# Altium footprint library Tomra_Cadstar_Footprints.PcbLib: 380 footprints (part 18 of 24)
Each footprint in its own frame and in the unit in brackets; x right, y up, seen from the top. Pads: shape width x height; smd on the part's side, far side on the other; paste and mask are expansions set on the pad; w line width, h text height; cw(c..) or ccw(c..) is an arc to the next point about the centre after c.
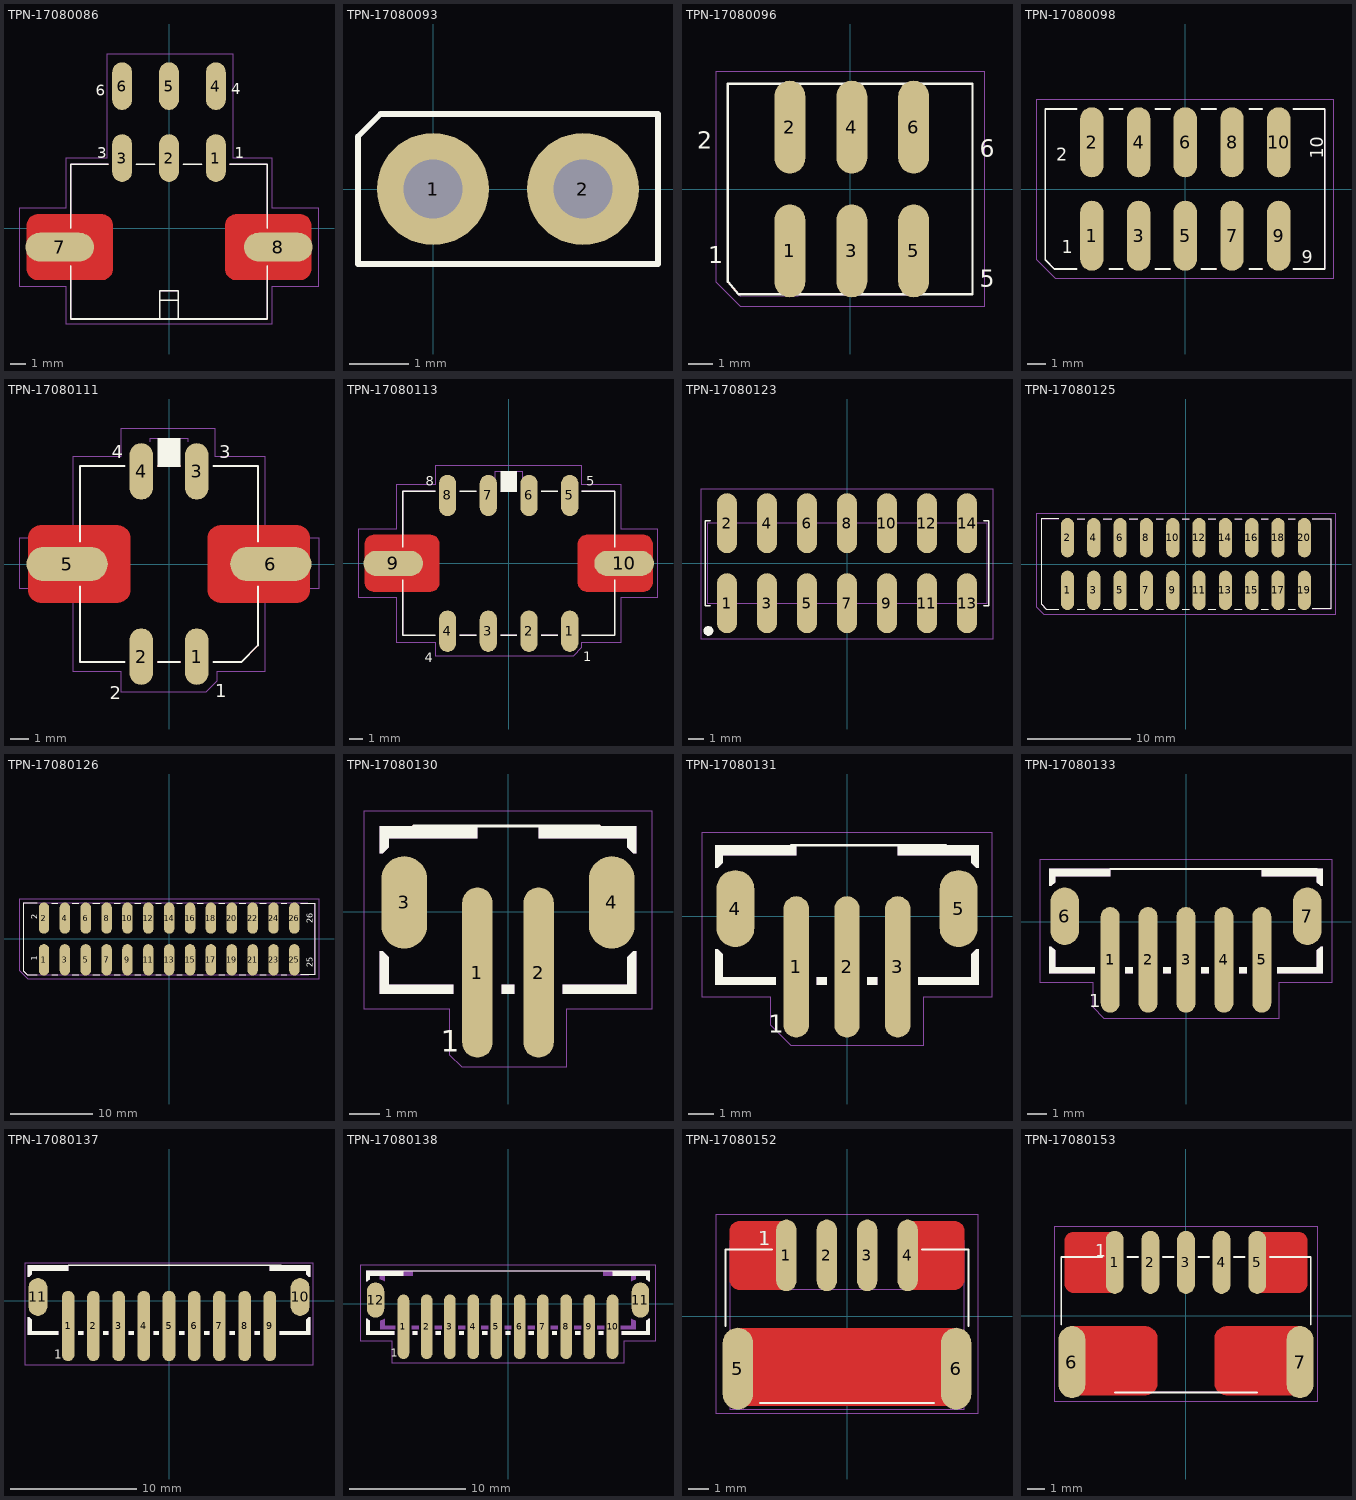
[diagram p17: the footprints below, top view; thin cyan lines are the x and y axes]

## TPN-17080086 [mm]
height 8
pads (8):
  oval 1.27x3.048 smd paste+0 mask+0: 1(3,4.5) 2(0,4.5) 3(-3,4.5) 4(3,9.1) 5(0,9.1) 6(-3,9.1)
  oval 4.39x1.85 smd paste+0 mask+0: 7(-7,-1.2) 8(7,-1.2)
Top Elec:
  region: -9.1,0.2 -9.1,0.269 -9.073,0.404 -9.02,0.532 -8.944,0.646 -8.846,0.744 -8.732,0.82 -8.604,0.873 -8.469,0.9 -8.4,0.9 -4.3,0.9 -4.231,0.9 -4.096,0.873 -3.968,0.82 -3.854,0.744 -3.756,0.646 -3.68,0.532 -3.627,0.404 -3.6,0.269 -3.6,0.2 -3.6,-2.6 -3.6,-2.669 -3.627,-2.804 -3.68,-2.932 -3.756,-3.046 -3.854,-3.144 -3.968,-3.22 -4.096,-3.273 -4.231,-3.3 -4.3,-3.3 -8.4,-3.3 -8.469,-3.3 -8.604,-3.273 -8.732,-3.22 -8.846,-3.144 -8.944,-3.046 -9.02,-2.932 -9.073,-2.804 -9.1,-2.669 -9.1,-2.6
  region: 3.6,0.2 3.6,0.269 3.627,0.404 3.68,0.532 3.756,0.646 3.854,0.744 3.968,0.82 4.096,0.873 4.231,0.9 4.3,0.9 8.4,0.9 8.469,0.9 8.604,0.873 8.732,0.82 8.846,0.744 8.944,0.646 9.02,0.532 9.073,0.404 9.1,0.269 9.1,0.2 9.1,-2.6 9.1,-2.669 9.073,-2.804 9.02,-2.932 8.944,-3.046 8.846,-3.144 8.732,-3.22 8.604,-3.273 8.469,-3.3 8.4,-3.3 4.3,-3.3 4.231,-3.3 4.096,-3.273 3.968,-3.22 3.854,-3.144 3.756,-3.046 3.68,-2.932 3.627,-2.804 3.6,-2.669 3.6,-2.6
Top Silk:
  lines w0.1: -6.3,-2.4 -6.3,-5.8 6.3,-5.8 6.3,-2.4 ; -6.3,0 -6.3,4.1 -3.9,4.1 ; -2.1,4.1 -0.9,4.1 ; -0.6,-4.6 0.6,-4.6 ; 0.9,4.1 2.1,4.1 ; 3.9,4.1 6.3,4.1 6.3,0 ; -0.6,-5.8 0.6,-5.8 0.6,-4 -0.6,-4 -0.6,-5.8
  text "1" at 4.2,4.5 h0.7
  text "6" at -4.7,8.5 h0.7
  text "3" at -4.6,4.5 h0.7
  text "4" at 4,8.6 h0.7
  text ".Designator" at 0,0 h0.7
Top Assembly:
  lines w0.05: -6.3,-2.4 -6.3,-5.8 6.3,-5.8 6.3,-2.4 ; -6.3,0 -6.3,4.1 -3.9,4.1 ; -2.1,4.1 -0.9,4.1 ; -0.6,-4.6 0.6,-4.6 ; 0.9,4.1 2.1,4.1 ; 3.9,4.1 6.3,4.1 6.3,0 ; -0.6,-5.8 0.6,-5.8 0.6,-4 -0.6,-4 -0.6,-5.8
  text "1" at 4.2,4.5 h0.7
  text "6" at -4.7,8.5 h0.7
  text "3" at -4.6,4.5 h0.7
  text "4" at 4,8.6 h0.7
Top Placement:
  lines w0.01: -9.6,-3.7 -9.6,1.3 -6.6,1.3 -6.6,4.5 -4,4.5 -4,11.14 4.1,11.14 4.1,4.5 6.6,4.5 6.6,1.3 9.6,1.3 9.6,-3.7 6.6,-3.7 6.6,-6.1 -6.6,-6.1 -6.6,-3.7 -9.6,-3.7
  text "1" at 4.2,4.5 h0.7
  text "6" at -4.7,8.5 h0.7
  text "3" at -4.6,4.5 h0.7
  text "4" at 4,8.6 h0.7

## TPN-17080093 [mm]
height 9
pads (2):
  round 1.9 / inner round 1.524 / far side round 1.9 hole 1 paste+0.25 mask+0: 1(0,0) 2(2.54,0)
Top Silk:
  lines w0.1: -1.27,-1.27 -1.27,0.889 -0.889,1.27 3.81,1.27 3.81,-1.27 -1.27,-1.27
  text ".Designator" at -1.24,1.46 h0.7
Top Assembly:
  lines w0.05: -1.27,-1.27 -1.27,0.889 -0.889,1.27 3.81,1.27 3.81,-1.27 -1.27,-1.27
Top Placement:
  lines w0.01: -1.27,-1.27 -1.27,0.889 -0.889,1.27 3.81,1.27 3.81,-1.27 -1.27,-1.27

## TPN-17080096 [mil]
height 472.44
pads (6):
  oval 50x150 smd paste+0 mask+0: 1(-97.5,-100) 2(-97.5,100) 3(2.5,-100) 4(2.5,100) 5(102.5,-100) 6(102.5,100)
Top Silk:
  lines w3.94: -197.5,-150 -197.5,170 197.5,170 197.5,-170 -180.5,-170 -197.5,-150
  text "2" at -247.5,65 h27.56
  text "1" at -229.5,-120 h27.56
  text "6" at 209.5,52 h27.56
  text "5" at 209.5,-158 h27.56
  text ".Designator" at 0,0 h27.56
Top Assembly:
  lines w1.97: -197.5,-150 -197.5,170 197.5,170 197.5,-170 -177.5,-173 -197.5,-150
Top Placement:
  lines w0.39: -217.19,-150 -177.5,-189.69 217.19,-189.69 217.19,189.69 -217.19,189.69 -217.19,-150

## TPN-17080098 [mm]
height 12
pads (10):
  oval 1.27x3.81 smd paste+0 mask+0: 1(-5.08,-2.54) 2(-5.08,2.54) 3(-2.54,-2.54) 4(-2.54,2.54) 5(0,-2.54) 6(0,2.54) 7(2.54,-2.54) 8(2.54,2.54) 9(5.08,-2.54) 10(5.08,2.54)
Top Silk:
  lines w0.1: -5.92,-4.35 -7.12,-4.35 -7.62,-3.85 -7.62,4.35 -5.92,4.35 ; -4.12,-4.35 -3.42,-4.35 ; -4.12,4.35 -3.42,4.35 ; -1.62,-4.35 -0.82,-4.35 ; -1.62,4.35 -0.82,4.35 ; 0.88,-4.35 1.68,-4.35 ; 0.88,4.35 1.68,4.35 ; 3.48,-4.35 4.18,-4.35 ; 3.48,4.35 4.18,4.35 ; 5.88,-4.35 7.58,-4.35 7.58,4.35 5.88,4.35
  text "1" at -6.731,-3.505 h0.7
  text "2" at -7.01,1.549 h0.7
  text "10" at 7.493,1.651 h0.7
  text "9" at 6.325,-4.039 h0.7
  text ".Designator" at 0,0 h0.7
Top Assembly:
  lines w0.05: -5.92,-4.35 -7.12,-4.35 -7.62,-3.85 -7.62,4.35 -5.92,4.35 ; -4.12,-4.35 -3.42,-4.35 ; -4.12,4.35 -3.42,4.35 ; -1.62,-4.35 -0.82,-4.35 ; -1.62,4.35 -0.82,4.35 ; 0.88,-4.35 1.68,-4.35 ; 0.88,4.35 1.68,4.35 ; 3.48,-4.35 4.18,-4.35 ; 3.48,4.35 4.18,4.35 ; 5.88,-4.35 7.58,-4.35 7.58,4.35 5.88,4.35
  text "1" at -6.731,-3.505 h0.7
  text "2" at -7.01,1.549 h0.7
  text "10" at 7.493,1.651 h0.7
  text "9" at 6.325,-4.039 h0.7
Top Placement:
  lines w0.01: -8.12,-3.81 -7.08,-4.85 8.08,-4.85 8.08,4.85 -8.12,4.85 -8.12,-3.81

## TPN-17080111 [mm]
pads (6):
  oval 1.27x3.048 smd paste+0 mask+0: 1(1.5,-5) 2(-1.5,-5) 3(1.5,5) 4(-1.5,5)
  oval 4.39x1.85 smd paste+0 mask+0: 5(-5.5,0) 6(5.5,0)
Top Elec:
  region: -7.6,1.4 -7.6,1.469 -7.573,1.604 -7.52,1.732 -7.444,1.846 -7.346,1.944 -7.232,2.02 -7.104,2.073 -6.969,2.1 -6.9,2.1 -2.8,2.1 -2.731,2.1 -2.596,2.073 -2.468,2.02 -2.354,1.944 -2.256,1.846 -2.18,1.732 -2.127,1.604 -2.1,1.469 -2.1,1.4 -2.1,-1.4 -2.1,-1.469 -2.127,-1.604 -2.18,-1.732 -2.256,-1.846 -2.354,-1.944 -2.468,-2.02 -2.596,-2.073 -2.731,-2.1 -2.8,-2.1 -6.9,-2.1 -6.969,-2.1 -7.104,-2.073 -7.232,-2.02 -7.346,-1.944 -7.444,-1.846 -7.52,-1.732 -7.573,-1.604 -7.6,-1.469 -7.6,-1.4
  region: 2.1,1.4 2.1,1.469 2.127,1.604 2.18,1.732 2.256,1.846 2.354,1.944 2.468,2.02 2.596,2.073 2.731,2.1 2.8,2.1 6.9,2.1 6.969,2.1 7.104,2.073 7.232,2.02 7.346,1.944 7.444,1.846 7.52,1.732 7.573,1.604 7.6,1.469 7.6,1.4 7.6,-1.4 7.6,-1.469 7.573,-1.604 7.52,-1.732 7.444,-1.846 7.346,-1.944 7.232,-2.02 7.104,-2.073 6.969,-2.1 6.9,-2.1 2.8,-2.1 2.731,-2.1 2.596,-2.073 2.468,-2.02 2.354,-1.944 2.256,-1.846 2.18,-1.732 2.127,-1.604 2.1,-1.469 2.1,-1.4
Top Silk:
  region: -0.6,5.3 0.6,5.3 0.6,6.8 -0.6,6.8
  lines w0.1: -4.8,-1.2 -4.8,-5.3 -2.4,-5.3 ; -4.8,1.2 -4.8,5.3 -2.4,5.3 ; -0.6,-5.3 0.6,-5.3 ; -0.6,5.3 0.6,5.3 ; 2.4,-5.3 3.9,-5.3 4.8,-4.4 4.8,-1.2 ; 2.4,5.3 4.8,5.3 4.8,1.2
  text "1" at 2.5,-7.2 h0.7
  text "3" at 2.7,5.7 h0.7
  text "4" at -3.1,5.7 h0.7
  text "2" at -3.2,-7.3 h0.7
  text ".Designator" at -1,6.8 h0.7
Top Assembly:
  lines w0.05: -4.8,-1.2 -4.8,-5.3 -2.4,-5.3 ; -4.8,1.2 -4.8,5.3 -2.4,5.3 ; -1,6.6 -1,6.8 1,6.8 1,6.6 ; -0.6,-5.3 0.6,-5.3 ; -0.6,5.3 0.6,5.3 ; 2.4,-5.3 3.9,-5.3 4.8,-4.4 4.8,-1.2 ; 2.4,5.3 4.8,5.3 4.8,1.2
  text "1" at 2.5,-7.2 h0.7
  text "3" at 2.7,5.7 h0.7
  text "4" at -3.1,5.7 h0.7
  text "2" at -3.2,-7.3 h0.7
Top Placement:
  lines w0.01: -8.1,-1.3 -8.1,1.4 -5.2,1.4 -5.2,5.8 -2.6,5.8 -2.6,7.3 2.5,7.3 2.5,5.8 5.2,5.8 5.2,1.4 8.1,1.4 8.1,-1.3 5.2,-1.3 5.2,-5.8 2.6,-5.8 2.6,-6.3 2,-6.9 -2.6,-6.9 -2.6,-5.8 -5.2,-5.8 -5.2,-1.3 -8.1,-1.3
  text "1" at 2.5,-7.2 h0.7
  text "3" at 2.7,5.7 h0.7
  text "4" at -3.1,5.7 h0.7
  text "2" at -3.2,-7.3 h0.7

## TPN-17080113 [mm]
pads (10):
  oval 1.27x3.048 smd paste+0 mask+0: 1(4.5,-5) 2(1.5,-5) 3(-1.5,-5) 4(-4.5,-5) 5(4.5,5) 6(1.5,5) 7(-1.5,5) 8(-4.5,5)
  oval 4.39x1.85 smd paste+0 mask+0: 9(-8.5,0) 10(8.5,0)
Top Elec:
  region: -10.6,1.4 -10.6,1.469 -10.573,1.604 -10.52,1.732 -10.444,1.846 -10.346,1.944 -10.232,2.02 -10.104,2.073 -9.969,2.1 -9.9,2.1 -5.8,2.1 -5.731,2.1 -5.596,2.073 -5.468,2.02 -5.354,1.944 -5.256,1.846 -5.18,1.732 -5.127,1.604 -5.1,1.469 -5.1,1.4 -5.1,-1.4 -5.1,-1.469 -5.127,-1.604 -5.18,-1.732 -5.256,-1.846 -5.354,-1.944 -5.468,-2.02 -5.596,-2.073 -5.731,-2.1 -5.8,-2.1 -9.9,-2.1 -9.969,-2.1 -10.104,-2.073 -10.232,-2.02 -10.346,-1.944 -10.444,-1.846 -10.52,-1.732 -10.573,-1.604 -10.6,-1.469 -10.6,-1.4
  region: 5.1,1.4 5.1,1.469 5.127,1.604 5.18,1.732 5.256,1.846 5.354,1.944 5.468,2.02 5.596,2.073 5.731,2.1 5.8,2.1 9.9,2.1 9.969,2.1 10.104,2.073 10.232,2.02 10.346,1.944 10.444,1.846 10.52,1.732 10.573,1.604 10.6,1.469 10.6,1.4 10.6,-1.4 10.6,-1.469 10.573,-1.604 10.52,-1.732 10.444,-1.846 10.346,-1.944 10.232,-2.02 10.104,-2.073 9.969,-2.1 9.9,-2.1 5.8,-2.1 5.731,-2.1 5.596,-2.073 5.468,-2.02 5.354,-1.944 5.256,-1.846 5.18,-1.732 5.127,-1.604 5.1,-1.469 5.1,-1.4
Top Silk:
  region: -0.6,5.3 0.6,5.3 0.6,6.8 -0.6,6.8
  lines w0.1: -7.8,-1.2 -7.8,-5.3 -5.4,-5.3 ; -7.8,1.2 -7.8,5.3 -5.4,5.3 ; -3.6,-5.3 -2.4,-5.3 ; -3.6,5.3 -2.4,5.3 ; -0.6,-5.3 0.6,-5.3 ; -0.6,5.3 0.6,5.3 ; 2.4,-5.3 3.6,-5.3 ; 2.4,5.3 3.6,5.3 ; 5.4,-5.3 7.8,-5.3 7.8,-1.2 ; 5.4,5.3 7.8,5.3 7.8,1.2
  text "1" at 5.5,-7.2 h0.7
  text "4" at -6.2,-7.3 h0.7
  text "5" at 5.7,5.7 h0.7
  text "8" at -6.1,5.7 h0.7
  text ".Designator" at -1,6.8 h0.7
Top Assembly:
  lines w0.05: -7.8,-1.2 -7.8,-5.3 -5.4,-5.3 ; -7.8,1.2 -7.8,5.3 -5.4,5.3 ; -3.6,-5.3 -2.4,-5.3 ; -3.6,5.3 -2.4,5.3 ; -1,5.3 -1,6.8 1,6.8 1,5.3 ; -0.6,-5.3 0.6,-5.3 ; -0.6,5.3 0.6,5.3 ; 2.4,-5.3 3.6,-5.3 ; 2.4,5.3 3.6,5.3 ; 5.4,-5.3 7.8,-5.3 7.8,-1.2 ; 5.4,5.3 7.8,5.3 7.8,1.2
  text "1" at 5.5,-7.2 h0.7
  text "4" at -6.2,-7.3 h0.7
  text "5" at 5.7,5.7 h0.7
  text "8" at -6.1,5.7 h0.7
Top Placement:
  lines w0.01: -11.1,-2.5 -11.1,2.5 -8.3,2.5 -8.3,5.8 -5.4,5.8 -5.4,7.2 5.4,7.2 5.4,5.8 8.3,5.8 8.3,2.5 11,2.5 11,-2.5 8.3,-2.5 8.3,-5.8 5.4,-5.8 5.4,-6.2 4.8,-6.8 -5.4,-6.8 -5.4,-5.8 -8.3,-5.8 -8.3,-2.5 -11.1,-2.5
  text "1" at 5.5,-7.2 h0.7
  text "4" at -6.2,-7.3 h0.7
  text "5" at 5.7,5.7 h0.7
  text "8" at -6.1,5.7 h0.7

## TPN-17080123 [mm]
height 12
pads (14):
  oval 1.27x3.81 smd paste+0 mask+0: 1(-7.62,-2.54) 2(-7.62,2.54) 3(-5.08,-2.54) 4(-5.08,2.54) 5(-2.54,-2.54) 6(-2.54,2.54) 7(0,-2.54) 8(0,2.54) 9(2.54,-2.54) 10(2.54,2.54) 11(5.08,-2.54) 12(5.08,2.54) 13(7.62,-2.54) 14(7.62,2.54)
Top Silk:
  region: -8.8,-4.6 -8.86,-4.6 -8.97,-4.554 -9.054,-4.47 -9.1,-4.36 -9.1,-4.24 -9.054,-4.13 -8.97,-4.046 -8.86,-4 -8.8,-4 -8.74,-4 -8.63,-4.046 -8.546,-4.13 -8.5,-4.24 -8.5,-4.36 -8.546,-4.47 -8.63,-4.554 -8.74,-4.6
  lines w0.1: -8.7,-2.7 -9,-2.7 -9,2.7 -8.7,2.7 ; 8.7,-2.7 9,-2.7 9,2.7 8.7,2.7
  text ".Designator" at -7.7,4.7 h0.7
Top Assembly:
  lines w0.05: -8.89,-2.54 8.89,-2.54 8.89,2.54 -8.89,2.54 -8.89,-2.54
  text "2" at -8.7,2.7 h0.18
  text "14" at 8.5,2.6 h0.18
  text "13" at 8.5,-3.1 h0.18
  text "1" at -8.6,-3.1 h0.18
Top Placement:
  lines w0.01: -9.3,-4.8 9.3,-4.8 9.3,4.7 -9.3,4.7 -9.3,-4.8

## TPN-17080125 [mm]
height 12
pads (20):
  oval 1.27x3.81 smd paste+0 mask+0: 1(-11.43,-2.54) 2(-11.43,2.54) 3(-8.89,-2.54) 4(-8.89,2.54) 5(-6.35,-2.54) 6(-6.35,2.54) 7(-3.81,-2.54) 8(-3.81,2.54) 9(-1.27,-2.54) 10(-1.27,2.54) 11(1.27,-2.54) 12(1.27,2.54) 13(3.81,-2.54) 14(3.81,2.54) 15(6.35,-2.54) 16(6.35,2.54) 17(8.89,-2.54) 18(8.89,2.54) 19(11.43,-2.54) 20(11.43,2.54)
Top Silk:
  lines w0.1: -12.27,-4.35 -13.47,-4.35 -13.97,-3.85 -13.97,4.35 -12.27,4.35 ; -10.47,-4.35 -9.77,-4.35 ; -10.47,4.35 -9.77,4.35 ; -7.97,-4.35 -7.17,-4.35 ; -7.97,4.35 -7.17,4.35 ; -5.47,-4.35 -4.67,-4.35 ; -5.47,4.35 -4.67,4.35 ; -2.87,-4.35 -2.17,-4.35 ; -2.87,4.35 -2.17,4.35 ; -0.37,-4.35 0.33,-4.35 ; -0.37,4.35 0.33,4.35 ; 2.17,-4.35 2.87,-4.35 ; 2.17,4.35 2.87,4.35 ; 4.71,-4.35 5.41,-4.35 ; 4.71,4.35 5.41,4.35 ; 7.25,-4.35 7.95,-4.35 ; 7.25,4.35 7.95,4.35 ; 9.85,-4.35 10.55,-4.35 ; 9.85,4.35 10.55,4.35 ; 12.18,-4.34 13.98,-4.34 13.98,4.36 12.18,4.36
  text ".Designator" at 0,0 h0.7
Top Assembly:
  lines w0.05: -12.268,-4.357 -13.468,-4.357 -13.968,-3.857 -13.968,4.343 -12.268,4.343 ; -10.468,-4.357 -9.768,-4.357 ; -10.468,4.343 -9.768,4.343 ; -7.968,-4.357 -7.168,-4.357 ; -7.968,4.343 -7.168,4.343 ; -5.468,-4.357 -4.668,-4.357 ; -5.468,4.343 -4.668,4.343 ; -2.868,-4.357 -2.168,-4.357 ; -2.868,4.343 -2.168,4.343 ; -0.368,-4.357 0.332,-4.357 ; -0.368,4.343 0.332,4.343 ; 2.172,-4.357 2.872,-4.357 ; 2.172,4.343 2.872,4.343 ; 4.712,-4.357 5.412,-4.357 ; 4.712,4.343 5.412,4.343 ; 7.252,-4.357 7.952,-4.357 ; 7.252,4.343 7.952,4.343 ; 9.852,-4.357 10.552,-4.357 ; 9.852,4.343 10.552,4.343 ; 12.182,-4.347 13.982,-4.347 13.982,4.353 12.182,4.353
Top Placement:
  lines w0.01: -14.47,-4.115 -13.738,-4.847 14.482,-4.847 14.482,4.85 -14.47,4.85 -14.47,-4.115

## TPN-17080126 [mm]
height 12
pads (26):
  oval 1.27x3.81 smd paste+0 mask+0: 1(-15.24,-2.54) 2(-15.24,2.54) 3(-12.7,-2.54) 4(-12.7,2.54) 5(-10.16,-2.54) 6(-10.16,2.54) 7(-7.62,-2.54) 8(-7.62,2.54) 9(-5.08,-2.54) 10(-5.08,2.54) 11(-2.54,-2.54) 12(-2.54,2.54) 13(0,-2.54) 14(0,2.54) 15(2.54,-2.54) 16(2.54,2.54) 17(5.08,-2.54) 18(5.08,2.54) 19(7.62,-2.54) 20(7.62,2.54) 21(10.16,-2.54) 22(10.16,2.54) 23(12.7,-2.54) 24(12.7,2.54) 25(15.24,-2.54) 26(15.24,2.54)
Top Silk:
  lines w0.1: -16.08,-4.35 -17.28,-4.35 -17.78,-3.85 -17.78,4.35 -16.08,4.35 ; -14.28,-4.35 -13.58,-4.35 ; -14.28,4.35 -13.58,4.35 ; -11.78,-4.35 -10.98,-4.35 ; -11.78,4.35 -10.98,4.35 ; -9.28,-4.35 -8.48,-4.35 ; -9.28,4.35 -8.48,4.35 ; -6.68,-4.35 -5.98,-4.35 ; -6.68,4.35 -5.98,4.35 ; -4.18,-4.35 -3.48,-4.35 ; -4.18,4.35 -3.48,4.35 ; -1.64,-4.35 -0.94,-4.35 ; -1.64,4.35 -0.94,4.35 ; 0.9,-4.35 1.6,-4.35 ; 0.9,4.35 1.6,4.35 ; 3.44,-4.35 4.14,-4.35 ; 3.44,4.35 4.14,4.35 ; 6.04,-4.35 6.74,-4.35 ; 6.04,4.35 6.74,4.35 ; 8.54,-4.35 9.34,-4.35 ; 8.54,4.35 9.34,4.35 ; 11.04,-4.35 11.84,-4.35 ; 11.04,4.35 11.84,4.35 ; 13.64,-4.35 14.34,-4.35 ; 13.64,4.35 14.34,4.35 ; 16.035,-4.361 17.735,-4.361 17.735,4.339 16.035,4.339
  text "2" at -16.053,2.413 h0.7
  text "1" at -16.053,-2.667 h0.7
  text "2" at -16.053,2.413 h0.7
  text "1" at -16.053,-2.667 h0.7
  text "26" at 17.47,1.894 h0.7
  text "25" at 17.47,-3.44 h0.7
  text "25" at 17.47,-3.44 h0.7
  text "26" at 17.47,1.894 h0.7
  text ".Designator" at 0,0 h0.7
Top Assembly:
  lines w0.05: 15.97,-4.34 17.67,-4.34 17.67,4.36 15.97,4.36 ; 16.87,4.36 -17.78,4.35 -17.78,-3.85 -17.28,-4.35 16.97,-4.34
  text "2" at -16.053,2.413 h0.7
  text "1" at -16.053,-2.667 h0.7
  text "2" at -16.053,2.413 h0.7
  text "1" at -16.053,-2.667 h0.7
  text "25" at 17.47,-3.44 h0.7
  text "26" at 17.47,1.894 h0.7
Top Placement:
  lines w0.01: -18.28,-3.81 -17.229,-4.861 18.235,-4.861 18.235,4.85 -18.28,4.85 -18.28,-3.81

## TPN-17080130 [mm]
height 7
pads (4):
  oval 1x5.572 smd paste+0 mask+0: 1(-1,-2) 2(1,-2)
  oval 1.5x3.024 smd paste+0 mask+0: 3(-3.4,0.3) 4(3.4,0.3)
Top Silk:
  region: 1,2.8 4.2,2.8 4.2,1.9 4.1,1.9 3.9,2.1 3.9,2.4 1,2.4
  region: -1,2.8 -4.2,2.8 -4.2,1.9 -4.1,1.9 -3.9,2.1 -3.9,2.4 -1,2.4
  region: -0.2,-2.4 0.2,-2.4 0.2,-2.7 -0.2,-2.7
  region: -4.2,-1.3 -4.1,-1.3 -3.9,-1.5 -3.9,-2.4 -1.8,-2.4 -1.8,-2.7 -4.2,-2.7
  region: 4.2,-1.3 4.1,-1.3 3.9,-1.5 3.9,-2.4 1.8,-2.4 1.8,-2.7 4.2,-2.7
  lines w0.1: -3.1,2.8 3,2.8
  text "1" at -2.2,-4.6 h0.7
  text ".Designator" at 0,0 h0.7
Top Assembly:
  region: 1,2.8 4.2,2.8 4.2,1.9 4.1,1.9 3.9,2.1 3.9,2.4 1,2.4
  region: -1,2.8 -4.2,2.8 -4.2,1.9 -4.1,1.9 -3.9,2.1 -3.9,2.4 -1,2.4
  region: -0.2,-2.4 0.2,-2.4 0.2,-2.7 -0.2,-2.7
  region: -4.2,-1.3 -4.1,-1.3 -3.9,-1.5 -3.9,-2.4 -1.8,-2.4 -1.8,-2.7 -4.2,-2.7
  region: 4.2,-1.3 4.1,-1.3 3.9,-1.5 3.9,-2.4 1.8,-2.4 1.8,-2.7 4.2,-2.7
  lines w0.05: -3.1,2.8 3,2.8
  text "1" at -2.1,-4.6 h0.7
Top Placement:
  lines w0.01: -4.7,-3.2 -4.7,3.3 4.7,3.3 4.7,-3.2 1.9,-3.2 1.9,-5.1 -1.5,-5.1 -1.9,-4.7 -1.9,-3.2 -4.7,-3.2
  text "JST PH-2" at -2.4,1.1 h0.7

## TPN-17080131 [mm]
height 7
pads (5):
  oval 1x5.572 smd paste+0 mask+0: 1(-2,-2) 2(0,-2) 3(2,-2)
  oval 1.5x3.024 smd paste+0 mask+0: 4(-4.4,0.3) 5(4.4,0.3)
Top Silk:
  region: -2,2.8 -5.2,2.8 -5.2,1.9 -5.1,1.9 -4.9,2.1 -4.9,2.4 -2,2.4
  region: -1.2,-2.4 -0.8,-2.4 -0.8,-2.7 -1.2,-2.7
  region: -5.2,-1.3 -5.1,-1.3 -4.9,-1.5 -4.9,-2.4 -2.8,-2.4 -2.8,-2.7 -5.2,-2.7
  region: 2,2.8 5.2,2.8 5.2,1.9 5.1,1.9 4.9,2.1 4.9,2.4 2,2.4
  region: 5.2,-1.3 5.1,-1.3 4.9,-1.5 4.9,-2.4 2.8,-2.4 2.8,-2.7 5.2,-2.7
  region: 0.8,-2.4 1.2,-2.4 1.2,-2.7 0.8,-2.7
  lines w0.1: -2.2,2.8 3.9,2.8
  text "1" at -3.1,-4.6 h0.7
  text ".Designator" at 0,0 h0.7
Top Assembly:
  region: -2,2.8 -5.2,2.8 -5.2,1.9 -5.1,1.9 -4.9,2.1 -4.9,2.4 -2,2.4
  region: -1.2,-2.4 -0.8,-2.4 -0.8,-2.7 -1.2,-2.7
  region: -5.2,-1.3 -5.1,-1.3 -4.9,-1.5 -4.9,-2.4 -2.8,-2.4 -2.8,-2.7 -5.2,-2.7
  region: 2,2.8 5.2,2.8 5.2,1.9 5.1,1.9 4.9,2.1 4.9,2.4 2,2.4
  region: 5.2,-1.3 5.1,-1.3 4.9,-1.5 4.9,-2.4 2.8,-2.4 2.8,-2.7 5.2,-2.7
  region: 0.8,-2.4 1.2,-2.4 1.2,-2.7 0.8,-2.7
  lines w0.05: -2.2,2.8 3.9,2.8
  text "1" at -3,-4.6 h0.7
Top Placement:
  lines w0.01: -5.7,-3.2 -5.7,3.3 5.7,3.3 5.7,-3.2 3,-3.2 3,-5.1 -2.2,-5.1 -3,-4.3 -3,-3.2 -5.7,-3.2
  text "JST PH-3" at -2.6,1.1 h0.7

## TPN-17080133 [mm]
height 7
pads (7):
  oval 1x5.572 smd paste+0 mask+0: 1(-4,-2) 2(-2,-2) 3(0,-2) 4(2,-2) 5(4,-2)
  oval 1.5x3.024 smd paste+0 mask+0: 6(-6.4,0.3) 7(6.4,0.3)
Top Silk:
  region: 0.8,-2.4 1.2,-2.4 1.2,-2.7 0.8,-2.7
  region: 7.2,-1.3 7.1,-1.3 6.9,-1.5 6.9,-2.4 4.8,-2.4 4.8,-2.7 7.2,-2.7
  region: 4,2.8 7.2,2.8 7.2,1.9 7.1,1.9 6.9,2.1 6.9,2.4 4,2.4
  region: 2.8,-2.4 3.2,-2.4 3.2,-2.7 2.8,-2.7
  region: -4,2.8 -7.2,2.8 -7.2,1.9 -7.1,1.9 -6.9,2.1 -6.9,2.4 -4,2.4
  region: -3.2,-2.4 -2.8,-2.4 -2.8,-2.7 -3.2,-2.7
  region: -7.2,-1.3 -7.1,-1.3 -6.9,-1.5 -6.9,-2.4 -4.8,-2.4 -4.8,-2.7 -7.2,-2.7
  region: -1.2,-2.4 -0.8,-2.4 -0.8,-2.7 -1.2,-2.7
  lines w0.1: -4,2.8 6.9,2.8
  text "1" at -5.1,-4.5 h0.7
  text ".Designator" at 0,0 h0.7
Top Assembly:
  region: 0.8,-2.4 1.2,-2.4 1.2,-2.7 0.8,-2.7
  region: 7.2,-1.3 7.1,-1.3 6.9,-1.5 6.9,-2.4 4.8,-2.4 4.8,-2.7 7.2,-2.7
  region: 4,2.8 7.2,2.8 7.2,1.9 7.1,1.9 6.9,2.1 6.9,2.4 4,2.4
  region: 2.8,-2.4 3.2,-2.4 3.2,-2.7 2.8,-2.7
  region: -4,2.8 -7.2,2.8 -7.2,1.9 -7.1,1.9 -6.9,2.1 -6.9,2.4 -4,2.4
  region: -3.2,-2.4 -2.8,-2.4 -2.8,-2.7 -3.2,-2.7
  region: -7.2,-1.3 -7.1,-1.3 -6.9,-1.5 -6.9,-2.4 -4.8,-2.4 -4.8,-2.7 -7.2,-2.7
  region: -1.2,-2.4 -0.8,-2.4 -0.8,-2.7 -1.2,-2.7
  lines w0.05: -4,2.8 6.9,2.8
  text "1" at -5,-4.5 h0.7
Top Placement:
  lines w0.01: -7.7,-3.2 -7.7,3.3 7.7,3.3 7.7,-3.2 4.9,-3.2 4.9,-5.1 -4.3,-5.1 -4.9,-4.5 -4.9,-3.2 -7.7,-3.2
  text "JST PH-5-180" at -3.8,1.1 h0.7

## TPN-17080137 [mm]
height 7
pads (11):
  oval 1x5.572 smd paste+0 mask+0: 1(-8,-2) 2(-6,-2) 3(-4,-2) 4(-2,-2) 5(0,-2) 6(2,-2) 7(4,-2) 8(6,-2) 9(8,-2)
  oval 1.5x3 smd paste+0 mask+0: 10(10.4,0.3) 11(-10.4,0.3)
Top Silk:
  region: -3.2,-2.4 -2.8,-2.4 -2.8,-2.7 -3.2,-2.7
  region: -1.2,-2.4 -0.8,-2.4 -0.8,-2.7 -1.2,-2.7
  region: -8,2.8 -11.2,2.8 -11.2,1.9 -11.1,1.9 -10.9,2.1 -10.9,2.4 -8,2.4
  region: -7.2,-2.4 -6.8,-2.4 -6.8,-2.7 -7.2,-2.7
  region: -11.2,-1.3 -11.1,-1.3 -10.9,-1.5 -10.9,-2.4 -8.8,-2.4 -8.8,-2.7 -11.2,-2.7
  region: -5.2,-2.4 -4.8,-2.4 -4.8,-2.7 -5.2,-2.7
  region: 0.8,-2.4 1.2,-2.4 1.2,-2.7 0.8,-2.7
  region: 2.8,-2.4 3.2,-2.4 3.2,-2.7 2.8,-2.7
  region: 4.8,-2.4 5.2,-2.4 5.2,-2.7 4.8,-2.7
  region: 11.2,-1.3 11.1,-1.3 10.9,-1.5 10.9,-2.4 8.8,-2.4 8.8,-2.7 11.2,-2.7
  region: 8,2.8 11.2,2.8 11.2,1.9 11.1,1.9 10.9,2.1 10.9,2.4 8,2.4
  region: 6.8,-2.4 7.2,-2.4 7.2,-2.7 6.8,-2.7
  lines w0.1: -8,2.8 8.9,2.8
  text "1" at -9.1,-4.6 h0.7
  text ".Designator" at -11.2,2.8 h0.7
Top Assembly:
  region: -3.2,-2.4 -2.8,-2.4 -2.8,-2.7 -3.2,-2.7
  region: -1.2,-2.4 -0.8,-2.4 -0.8,-2.7 -1.2,-2.7
  region: -8,2.8 -11.2,2.8 -11.2,1.9 -11.1,1.9 -10.9,2.1 -10.9,2.4 -8,2.4
  region: -7.2,-2.4 -6.8,-2.4 -6.8,-2.7 -7.2,-2.7
  region: -11.2,-1.3 -11.1,-1.3 -10.9,-1.5 -10.9,-2.4 -8.8,-2.4 -8.8,-2.7 -11.2,-2.7
  region: -5.2,-2.4 -4.8,-2.4 -4.8,-2.7 -5.2,-2.7
  region: 0.8,-2.4 1.2,-2.4 1.2,-2.7 0.8,-2.7
  region: 2.8,-2.4 3.2,-2.4 3.2,-2.7 2.8,-2.7
  region: 4.8,-2.4 5.2,-2.4 5.2,-2.7 4.8,-2.7
  region: 11.2,-1.3 11.1,-1.3 10.9,-1.5 10.9,-2.4 8.8,-2.4 8.8,-2.7 11.2,-2.7
  region: 8,2.8 11.2,2.8 11.2,1.9 11.1,1.9 10.9,2.1 10.9,2.4 8,2.4
  region: 6.8,-2.4 7.2,-2.4 7.2,-2.7 6.8,-2.7
  lines w0.05: -8,2.8 8.9,2.8
  text "1" at -9,-4.6 h0.7
Top Placement:
  lines w0.01: -11.4,-5.1 11.4,-5.1 11.4,3 -11.4,3 -11.4,-5.1

## TPN-17080138 [mm]
height 7
pads (12):
  oval 1x5.572 smd paste+0 mask+0: 1(-9,-2) 2(-7,-2) 3(-5,-2) 4(-3,-2) 5(-1,-2) 6(1,-2) 7(3,-2) 8(5,-2) 9(7,-2) 10(9,-2)
  oval 1.5x3.024 smd paste+0 mask+0: 11(11.4,0.3) 12(-11.4,0.3)
Top Silk:
  region: -4.2,-2.4 -3.8,-2.4 -3.8,-2.7 -4.2,-2.7
  region: -2.2,-2.4 -1.8,-2.4 -1.8,-2.7 -2.2,-2.7
  region: -9,2.8 -12.2,2.8 -12.2,1.9 -12.1,1.9 -11.9,2.1 -11.9,2.4 -9,2.4
  region: -8.2,-2.4 -7.8,-2.4 -7.8,-2.7 -8.2,-2.7
  region: -12.2,-1.3 -12.1,-1.3 -11.9,-1.5 -11.9,-2.4 -9.8,-2.4 -9.8,-2.7 -12.2,-2.7
  region: -6.2,-2.4 -5.8,-2.4 -5.8,-2.7 -6.2,-2.7
  region: -0.2,-2.4 0.2,-2.4 0.2,-2.7 -0.2,-2.7
  region: 1.8,-2.4 2.2,-2.4 2.2,-2.7 1.8,-2.7
  region: 3.8,-2.4 4.2,-2.4 4.2,-2.7 3.8,-2.7
  region: 5.8,-2.4 6.2,-2.4 6.2,-2.7 5.8,-2.7
  region: 12.2,-1.3 12.1,-1.3 11.9,-1.5 11.9,-2.4 9.8,-2.4 9.8,-2.7 12.2,-2.7
  region: 9,2.8 12.2,2.8 12.2,1.9 12.1,1.9 11.9,2.1 11.9,2.4 9,2.4
  region: 7.8,-2.4 8.2,-2.4 8.2,-2.7 7.8,-2.7
  lines w0.1: -9,2.8 11.9,2.8
  text "1" at -10.1,-4.6 h0.7
  text ".Designator" at 0,0 h0.7
Top Assembly:
  region: -0.3,-1.9 0.3,-1.9 0.3,-2.2 -0.3,-2.2
  region: 3.7,-1.9 4.3,-1.9 4.3,-2.2 3.7,-2.2
  region: 1.7,-1.9 2.3,-1.9 2.3,-2.2 1.7,-2.2
  region: -8.3,-1.9 -7.7,-1.9 -7.7,-2.2 -8.3,-2.2
  region: -6.3,-1.9 -5.7,-1.9 -5.7,-2.2 -6.3,-2.2
  region: -4.3,-1.9 -3.7,-1.9 -3.7,-2.2 -4.3,-2.2
  region: -2.3,-1.9 -1.7,-1.9 -1.7,-2.2 -2.3,-2.2
  region: -8.2,2.8 -8.2,2.4 -10.6,2.4 -10.6,1.9 -11,2.1 -11,2.8
  region: -11,-1.5 -11,-2.2 -9.7,-2.2 -9.7,-1.9 -10.6,-1.9 -10.6,-1.3
  region: 5.7,-1.9 6.3,-1.9 6.3,-2.2 5.7,-2.2
  region: 8.2,2.8 8.2,2.4 10.6,2.4 10.6,1.9 11,2.1 11,2.8
  region: 11,-1.5 11,-2.2 9.7,-2.2 9.7,-1.9 10.6,-1.9 10.6,-1.3
  region: 7.7,-1.9 8.3,-1.9 8.3,-2.2 7.7,-2.2
  region: -4.2,-2.4 -3.8,-2.4 -3.8,-2.7 -4.2,-2.7
  region: -2.2,-2.4 -1.8,-2.4 -1.8,-2.7 -2.2,-2.7
  region: -9,2.8 -12.2,2.8 -12.2,1.9 -12.1,1.9 -11.9,2.1 -11.9,2.4 -9,2.4
  region: -8.2,-2.4 -7.8,-2.4 -7.8,-2.7 -8.2,-2.7
  region: -12.2,-1.3 -12.1,-1.3 -11.9,-1.5 -11.9,-2.4 -9.8,-2.4 -9.8,-2.7 -12.2,-2.7
  region: -6.2,-2.4 -5.8,-2.4 -5.8,-2.7 -6.2,-2.7
  region: -0.2,-2.4 0.2,-2.4 0.2,-2.7 -0.2,-2.7
  region: 1.8,-2.4 2.2,-2.4 2.2,-2.7 1.8,-2.7
  region: 3.8,-2.4 4.2,-2.4 4.2,-2.7 3.8,-2.7
  region: 5.8,-2.4 6.2,-2.4 6.2,-2.7 5.8,-2.7
  region: 12.2,-1.3 12.1,-1.3 11.9,-1.5 11.9,-2.4 9.8,-2.4 9.8,-2.7 12.2,-2.7
  region: 9,2.8 12.2,2.8 12.2,1.9 12.1,1.9 11.9,2.1 11.9,2.4 9,2.4
  region: 7.8,-2.4 8.2,-2.4 8.2,-2.7 7.8,-2.7
  lines w0.05: -11,2.1 -11,2.8 10.8,2.8 10.8,2.1 ; -9,2.8 11.9,2.8
  text "1" at -10.1,-4.2 h0.7
Top Placement:
  lines w0.01: -12.7,-3.2 -10,-3.2 -10,-5.105 10,-5.105 10,-3.2 12.7,-3.2 12.7,3.3 -12.7,3.3 -12.7,-3.2
  text "JST PH-10-180" at -3.6,1.3 h0.7

## TPN-17080152 [mm]
height 5.8
pads (6):
  oval 1x3.54 smd paste+0 mask+0: 1(-3,3) 2(-1,3) 3(1,3) 4(3,3)
  oval 1.5x4.04 smd paste+0 mask+0: 5(-5.4,-2.6) 6(5.4,-2.6)
Top Elec:
  region: -6,-1.3 -6,-1.231 -5.973,-1.096 -5.92,-0.968 -5.844,-0.854 -5.746,-0.756 -5.632,-0.68 -5.504,-0.627 -5.369,-0.6 -5.3,-0.6 5.3,-0.6 5.369,-0.6 5.504,-0.627 5.632,-0.68 5.746,-0.756 5.844,-0.854 5.92,-0.968 5.973,-1.096 6,-1.231 6,-1.3 6,-3.75 6,-3.819 5.973,-3.954 5.92,-4.082 5.844,-4.196 5.746,-4.294 5.632,-4.37 5.504,-4.423 5.369,-4.45 5.3,-4.45 -5.3,-4.45 -5.369,-4.45 -5.504,-4.423 -5.632,-4.37 -5.746,-4.294 -5.844,-4.196 -5.92,-4.082 -5.973,-3.954 -6,-3.819 -6,-3.75
  region: -5.8,4.2 -5.8,4.299 -5.724,4.483 -5.583,4.624 -5.399,4.7 -5.3,4.7 -3.1,4.7 -3.001,4.7 -2.817,4.624 -2.676,4.483 -2.6,4.299 -2.6,4.2 -2.6,1.8 -2.6,1.701 -2.676,1.517 -2.817,1.376 -3.001,1.3 -3.1,1.3 -5.3,1.3 -5.399,1.3 -5.583,1.376 -5.724,1.517 -5.8,1.701 -5.8,1.8
  region: 2.6,4.2 2.6,4.299 2.676,4.483 2.817,4.624 3.001,4.7 3.1,4.7 5.3,4.7 5.399,4.7 5.583,4.624 5.724,4.483 5.8,4.299 5.8,4.2 5.8,1.8 5.8,1.701 5.724,1.517 5.583,1.376 5.399,1.3 5.3,1.3 3.1,1.3 3.001,1.3 2.817,1.376 2.676,1.517 2.6,1.701 2.6,1.8
Top Silk:
  lines w0.1: -4.3,-4.3 4.3,-4.3 ; -6,3.3 -3.7,3.3 -6,3.3 ; -6,3.3 -6,-0.5 -6,3.3 ; 6,3.3 3.7,3.3 6,3.3 ; 6,3.3 6,-0.5 6,3.3
  text "1" at -4.4,3.5 h0.7
  text ".Designator" at -5.3,5 h0.7
Top Assembly:
  lines w0.05: -5.8,-4.6 5.8,-4.6 5.8,3.7 3.7,3.7 3.7,1.3 -3.7,1.3 -3.7,3.7 -5.8,3.7 -5.8,-4.6
  text "1" at -4.2,2 h0.7
Top Placement:
  lines w0.01: -6.5,-4.8 6.5,-4.8 6.5,5 -6.5,5 -6.5,-4.8

## TPN-17080153 [mm]
height 7
pads (7):
  oval 1x3.54 smd paste+0 mask+0: 1(-4,3) 2(-2,3) 3(0,3) 4(2,3) 5(4,3)
  oval 1.5x4.04 smd paste+0 mask+0: 6(-6.4,-2.6) 7(6.4,-2.6)
Top Elec:
  region: -7,-1.3 -7,-1.231 -6.973,-1.096 -6.92,-0.968 -6.844,-0.854 -6.746,-0.756 -6.632,-0.68 -6.504,-0.627 -6.369,-0.6 -6.3,-0.6 -2.3,-0.6 -2.231,-0.6 -2.096,-0.627 -1.968,-0.68 -1.854,-0.756 -1.756,-0.854 -1.68,-0.968 -1.627,-1.096 -1.6,-1.231 -1.6,-1.3 -1.6,-3.75 -1.6,-3.819 -1.627,-3.954 -1.68,-4.082 -1.756,-4.196 -1.854,-4.294 -1.968,-4.37 -2.096,-4.423 -2.231,-4.45 -2.3,-4.45 -6.3,-4.45 -6.369,-4.45 -6.504,-4.423 -6.632,-4.37 -6.746,-4.294 -6.844,-4.196 -6.92,-4.082 -6.973,-3.954 -7,-3.819 -7,-3.75
  region: -6.8,4.2 -6.8,4.299 -6.724,4.483 -6.583,4.624 -6.399,4.7 -6.3,4.7 -4.1,4.7 -4.001,4.7 -3.817,4.624 -3.676,4.483 -3.6,4.299 -3.6,4.2 -3.6,1.8 -3.6,1.701 -3.676,1.517 -3.817,1.376 -4.001,1.3 -4.1,1.3 -6.3,1.3 -6.399,1.3 -6.583,1.376 -6.724,1.517 -6.8,1.701 -6.8,1.8
  region: 3.6,4.2 3.6,4.299 3.676,4.483 3.817,4.624 4.001,4.7 4.1,4.7 6.3,4.7 6.399,4.7 6.583,4.624 6.724,4.483 6.8,4.299 6.8,4.2 6.8,1.8 6.8,1.701 6.724,1.517 6.583,1.376 6.399,1.3 6.3,1.3 4.1,1.3 4.001,1.3 3.817,1.376 3.676,1.517 3.6,1.701 3.6,1.8
  region: 1.6,-1.3 1.6,-1.231 1.627,-1.096 1.68,-0.968 1.756,-0.854 1.854,-0.756 1.968,-0.68 2.096,-0.627 2.231,-0.6 2.3,-0.6 6.3,-0.6 6.369,-0.6 6.504,-0.627 6.632,-0.68 6.746,-0.756 6.844,-0.854 6.92,-0.968 6.973,-1.096 7,-1.231 7,-1.3 7,-3.75 7,-3.819 6.973,-3.954 6.92,-4.082 6.844,-4.196 6.746,-4.294 6.632,-4.37 6.504,-4.423 6.369,-4.45 6.3,-4.45 2.3,-4.45 2.231,-4.45 2.096,-4.423 1.968,-4.37 1.854,-4.294 1.756,-4.196 1.68,-4.082 1.627,-3.954 1.6,-3.819 1.6,-3.75
Top Silk:
  lines w0.1: -7,-0.5 -7,3.3 -4.7,3.3 ; -4,-4.3 -0.5,-4.3 ; -3.3,3.3 -2.7,3.3 ; -2,-4.3 3,-4.3 ; -1.3,3.3 -0.7,3.3 ; 0.5,-4.3 4,-4.3 ; 0.7,3.3 1.3,3.3 ; 2.7,3.3 3.3,3.3 ; 4.7,3.3 7,3.3 7,-0.5
  text "1" at -5.1,3.3 h0.7
  text ".Designator" at -7.4,5 h0.7
Top Assembly:
  lines w0.05: -7,-0.5 -7,3.3 -4.7,3.3 ; -5.5,-4.3 -0.5,-4.3 ; -3.3,3.3 -2.7,3.3 ; -2,-4.3 3,-4.3 ; -1.3,3.3 -0.7,3.3 ; 0.5,-4.3 5.5,-4.3 ; 0.7,3.3 1.3,3.3 ; 2.7,3.3 3.3,3.3 ; 4.7,3.3 7,3.3 7,-0.5
  text "1" at -5.1,3.3 h0.7
Top Placement:
  lines w0.01: -7.4,-4.8 7.4,-4.8 7.4,5 -7.4,5 -7.4,-4.8